# Altium footprint library My Library.PCBLIB: 198 footprints (part 11 of 13)
Each footprint in its own frame and in the unit in brackets; x right, y up, seen from the top. Pads: shape width x height; smd on the part's side, far side on the other; paste and mask are expansions set on the pad; w line width, h text height; cw(c..) or ccw(c..) is an arc to the next point about the centre after c.
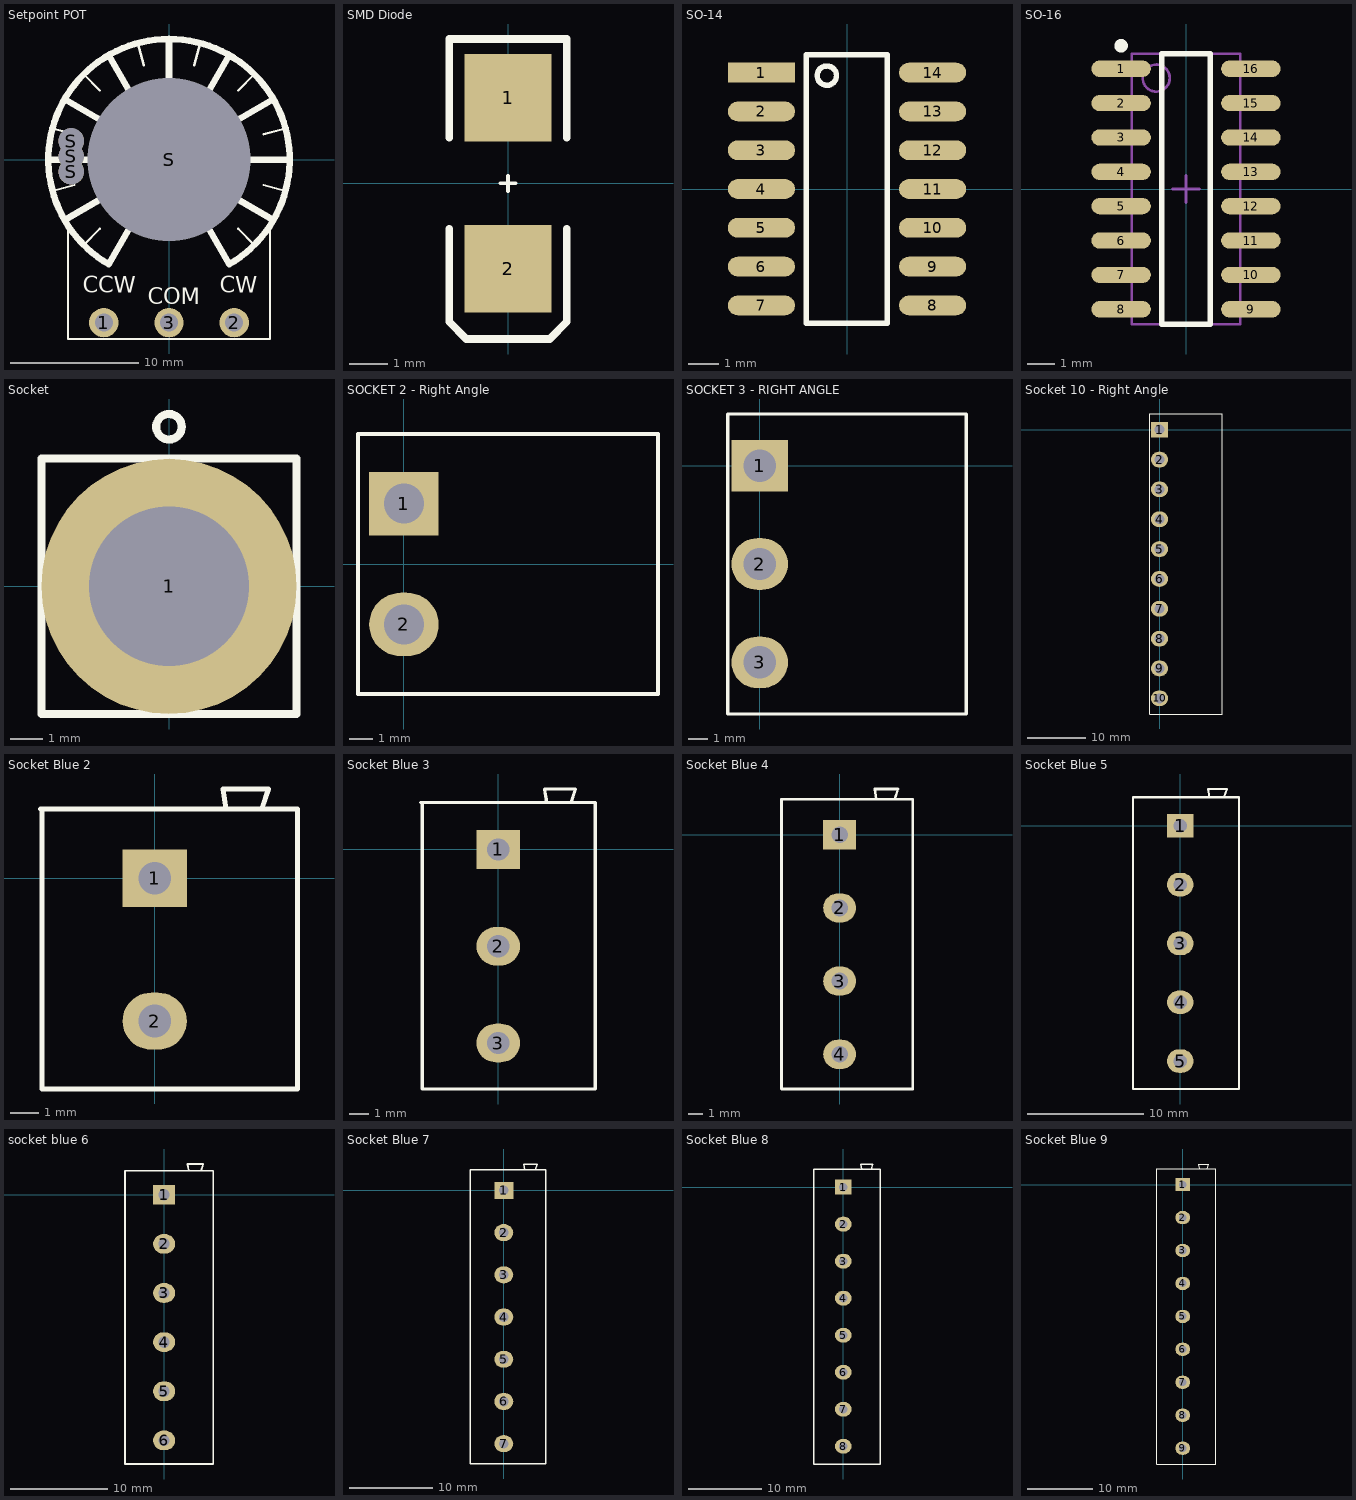
[diagram p10: the footprints below, top view; thin cyan lines are the x and y axes]

## Setpoint POT [mil]
pads (7):
  round 90 hole 55: 1(-200,-500) 2(200,-500) 3(0,-500)
  round 78.74 hole 78.74: S(-300,-37) S(-300,10) S(-300,57)
  round 492.13 hole 500: S(0,0)
Top Overlay:
  lines w7: -357.39,-95.76 -289.78,-77.65 ; -357.39,95.76 -289.78,77.65 ; -310,-200 -310,-550 310,-550 310,-200 ; -261.63,-261.63 -212.13,-212.13 ; -261.63,261.63 -212.13,212.13 ; -95.76,357.39 -77.65,289.78 ; 77.65,289.78 95.76,357.39 ; 212.13,-212.13 261.63,-261.63 ; 212.13,212.13 261.63,261.63 ; 289.78,-77.65 357.39,-95.76 ; 289.78,77.65 357.39,95.76
  lines w20: -370,0 -250,0 ; -320.43,-185 -216.51,-125 ; -320.43,185 -216.51,125 ; -185,320.43 -125,216.51 ; -125,-216.51 -185,-320.43 cw(c0,0) 185,-320.43 125,-216.51 ; 0,250 0,370 ; 125,216.51 185,320.43 ; 216.51,-125 320.43,-185 ; 216.51,125 320.43,185 ; 250,0 370,0
  text "CCW" at -264,-408 h50
  text "CW" at 155,-408 h50
  text "COM" at -65,-443 h50
3D body "volome cover2.STEP": height 1728.35, standoff 940.94, extent -298.41,-333.62 298.84,289.78
3D body "POT.STEP": height -636.77, standoff -1642.99, extent -310,-661 310,308.35

## SMD Diode [mm]
pads (2):
  rect 2.3x2.3 smd: 1(0,2.25) 2(0,-2.25)
Top Overlay:
  lines w0.1: -0.2,0 0.2,0 ; 0,-0.2 0,0.2
  lines w0.2: -1.55,-1.2 -1.55,-3.65 -1.1,-4.1 1.1,-4.1 1.55,-3.65 1.55,-1.2 ; -1.55,1.2 -1.55,3.8 1.55,3.8 1.55,1.2
3D body "User Library-Diode Molded Body.STEP": height 2.31, standoff 0.02, extent -1.321,-2.565 1.279,2.535

## SO-14 [mm] "SOIC, 14-Leads, Body 9.9x3.9mm, Pitch 1.27mm"
height 1.75
pads (14):
  rect 2.2x0.65 smd: 1(-2.8,3.81)
  oval 2.2x0.65 smd: 2(-2.8,2.54) 3(-2.8,1.27) 4(-2.8,0) 5(-2.8,-1.27) 6(-2.8,-2.54) 7(-2.8,-3.81) 8(2.8,-3.81) 9(2.8,-2.54) 10(2.8,-1.27) 11(2.8,0) 12(2.8,1.27) 13(2.8,2.54) 14(2.8,3.81)
Top Overlay:
  circle w0.178: c-0.659,3.711 r0.316
  lines w0.178: -1.339,-4.4 1.313,-4.4 1.313,4.4 -1.339,4.4 -1.339,-4.4
3D body "SO14.step": height 1.76, standoff 0, extent -3.196,-4.4 3.002,4.338

## SO-16 [mm] "SOIC, 16-Leads, Body 9.9x3.9mm, Pitch 1.27mm, IPC Medium Density"
height 1.75
pads (16):
  oval 2.2x0.6 smd: 1(-2.4,4.445) 2(-2.4,3.175) 3(-2.4,1.905) 4(-2.4,0.635) 5(-2.4,-0.635) 6(-2.4,-1.905) 7(-2.4,-3.175) 8(-2.4,-4.445) 9(2.4,-4.445) 10(2.4,-3.175) 11(2.4,-1.905) 12(2.4,-0.635) 13(2.4,0.635) 14(2.4,1.905) 15(2.4,3.175) 16(2.4,4.445)
Top Overlay:
  circle w0.25: c-2.4,5.295 r0.125
  lines w0.2: -0.9,-5 0.9,-5 0.9,5 -0.9,5 -0.9,-5
Mechanical 13:
  circle w0.1: c-1.1,4.1 r0.5
  lines w0.1: -2,-5 2,-5 2,5 -2,5 -2,-5
Mechanical 15:
  lines w0.1: -0.5,0 0.5,0 ; 0,-0.5 0,0.5
3D body "SOIC16.STEP": height 1.73, standoff -0.03, extent -3.099,-5.08 3.099,5.08

## Socket [mm]
pads (1):
  round 8 hole 5: 1(0,0)
Top Overlay:
  circle w0.254: c0,5 r0.4
  lines w0.254: -4,-4 4,-4 4,4 -4,4 -4,-4
3D body "New Socket-Short.STEP": height 26.7, standoff -4.75, extent -7.075,-7.075 7.075,7.075

## SOCKET 2 - Right Angle [mil]
pads (2):
  rect 115x105 hole 66: 1(0,100)
  oval 115x105 hole 66: 2(0,-100)
Top Overlay:
  lines w7: -76,-215 -76,215 420,215 420,-215 -76,-215
3D body "Socket Green_V2009.STEP": height 310, standoff -121.87, extent -60,-199.39 410,207.5

## SOCKET 3 - RIGHT ANGLE [mil]
pads (3):
  rect 115x105 hole 66: 1(0,0)
  oval 115x105 hole 66: 2(0,-200) 3(0,-400)
Top Overlay:
  lines w7: -65,-505 420,-505 420,105 -65,105 -65,-505
3D body "Socket Green_3Pin.STEP": height 310, standoff -161.24, extent -55,-505 415,105

## Socket 10 - Right Angle [mil]
pads (10):
  rect 115x105 hole 66: 1(0,0)
  oval 115x105 hole 66: 2(0,-200) 3(0,-400) 4(0,-600) 5(0,-800) 6(0,-1000) 7(0,-1200) 8(0,-1400) 9(0,-1600) 10(0,-1800)
Top Overlay:
  lines w7: -65,-1905 420,-1905 420,105 -65,105 -65,-1905
3D body "Socket Green_10Pin.STEP": height 310, standoff -161.24, extent -55,-1905 415,105

## Socket Blue 2 [mil]
pads (2):
  rect 90x80 hole 46: 1(0,0)
  oval 90x80 hole 46: 2(0,-200)
Top Overlay:
  lines w7: 100,97 95.33,125 159.33,125 150,97 ; -160,97 200,97 200,-295 -158,-295 -158,97 ; -160,97 -158,97 ; -160,97 -159,97 -158,97
3D body "Socket Blue_2Pin.STEP": height 493, standoff -263.18, extent -157,-295.46 200,127.46

## Socket Blue 3 [mil]
pads (3):
  rect 90x80 hole 46: 1(0,0)
  oval 90x80 hole 46: 2(0,-200) 3(0,-400)
Top Overlay:
  lines w7: 100,97 95.33,125 159.33,125 150,97 ; -160,97 200,97 200,-495.05 -157.44,-495.05 -157.44,97 -160,97
3D body "Socket Blue_3Pin.STEP": height 503, standoff -253.18, extent -157.44,-495.05 199.56,127.87

## Socket Blue 4 [mil]
pads (4):
  rect 90x80 hole 46: 1(0,0)
  oval 90x80 hole 46: 2(0,-200) 3(0,-400) 4(0,-600)
Top Overlay:
  lines w7: 100,97 95.33,125 159.33,125 150,97 ; -160,97 200,97 200,-694.91 -159,-694.91 -159,97 ; -160,97 -158,97 -159,97 ; -160,97 -159,97
3D body "Socket Blue_4Pin.STEP": height 493, standoff -263.18, extent -159,-694.91 198,128

## Socket Blue 5 [mil]
pads (5):
  rect 90x80 hole 46: 1(0,0)
  oval 90x80 hole 46: 2(0,-200) 3(0,-400) 4(0,-600) 5(0,-800)
Top Overlay:
  lines w7: 100,97 95.33,125 159.33,125 150,97 ; -160,-895 -160,97 200,97 200,-895 -160,-895
3D body "Socket Blue_5Pin.STEP": height 493, standoff -263.18, extent -158.5,-897.91 198.5,125

## socket blue 6 [mil]
pads (6):
  rect 90x80 hole 46: 1(0,0)
  oval 90x80 hole 46: 2(0,-200) 3(0,-400) 4(0,-600) 5(0,-800) 6(0,-1000)
Top Overlay:
  lines w7: -158,97 -160,97 ; 100,97 95.33,125 159.33,125 150,97 ; -160,97 200,97 200,-1096 -159,-1096 -159,97 -160,97
3D body "Socket Blue_6Pin.STEP": height 493, standoff -263.18, extent -159,-1096 198,126.91

## Socket Blue 7 [mil]
pads (7):
  rect 90x80 hole 46: 1(0,0)
  oval 90x80 hole 46: 2(0,-200) 3(0,-400) 4(0,-600) 5(0,-800) 6(0,-1000) 7(0,-1200)
Top Overlay:
  lines w7: -160,97 200,97 200,-1296.28 -159.15,-1296.28 -159.15,97 ; 100,97 95.33,125 159.33,125 150,97
3D body "Socket Blue_7Pin.STEP": height 493, standoff -263.18, extent -159.15,-1296.28 197.85,126.64

## Socket Blue 8 [mil]
pads (8):
  rect 90x80 hole 46: 1(0,0)
  oval 90x80 hole 46: 2(0,-200) 3(0,-400) 4(0,-600) 5(0,-800) 6(0,-1000) 7(0,-1200) 8(0,-1400)
Top Overlay:
  lines w7: -159.5,97 -159.5,-1495.91 200,-1495.91 200,97 -160,97 -158,97 ; 100,97 95.33,125 159.33,125 150,97
3D body "Socket Blue_8Pin.STEP": height 493, standoff -263.18, extent -159.5,-1495.91 197.5,127

## Socket Blue 9 [mil]
pads (9):
  rect 90x80 hole 46: 1(0,0)
  oval 90x80 hole 46: 2(0,-200) 3(0,-400) 4(0,-600) 5(0,-800) 6(0,-1000) 7(0,-1200) 8(0,-1400) 9(0,-1600)
Top Overlay:
  lines w7: 100,97 95.33,125 159.33,125 150,97 ; -160,97 200,97 200,-1696 -158,-1696 -158,97 -160,97
3D body "Socket Blue_9Pin.STEP": height 493, standoff -263.18, extent -158,-1696 199,126.91